# Altium integrated library Altium_WE-VD (rev23a).IntLib: 78 symbols (continued)
## 820523211
designator RV?, comment 320VAC, 418VDC  (value not drawn)
WE-VD Disk Varistor, THT, 320VAC, 418VDC, 760pF; Manufacturer Part Number: 820523211; Manufacturer: Wurth Elektronik; Clamping Voltage: 842V; Energy Absorption: 296J; Operating Voltage (AC): 320V; Operating Voltage (DC): 418V; Pitch: 1.5mm; Power Dissipation: 1W; (Reverse) Breakdown Voltage: 510V; (Reverse) Peak Pulse Current: 6500A; Category: Surge Protection; Match Code: WE-VD; ComponentLink1Description: Website Link; ComponentLink1URL: https://www.we-online.com/redexpert/article/820523211?ad; ComponentLink2Description: Datasheet Link; ComponentLink2URL: https://www.we-online.com/redexpert/spec/820523211?ad; Mount: Through Hole; Operating Temperature Max: 85°C; Operating Temperature Min: -40°C; Packaging: Tape and Reel; Width: 7.7mm; Height: 27mm; Diameter: 23mm; Channel Input Capacitance: 760pF
footprint D23W7.7H27P1.5
pins: 1, 2

## 820523811B
designator RV?, comment 385VAC, 505VDC  (value not drawn)
WE-VD Disk Varistor, THT, 385VAC, 505VDC, 600pF; Manufacturer Part Number: 820523811B; Manufacturer: Wurth Elektronik; Clamping Voltage: 1025V; Energy Absorption: 328J; Operating Voltage (AC): 385V; Operating Voltage (DC): 505V; Pitch: 2mm; Power Dissipation: 1W; (Reverse) Breakdown Voltage: 620V; (Reverse) Peak Pulse Current: 6500A; Category: Surge Protection; Match Code: WE-VD; ComponentLink1Description: Website Link; ComponentLink1URL: https://www.we-online.com/redexpert/article/820523811B?ad; ComponentLink2Description: Datasheet Link; ComponentLink2URL: https://www.we-online.com/redexpert/spec/820523811B?ad; Mount: Through Hole; Operating Temperature Max: 85°C; Operating Temperature Min: -40°C; Packaging: Tape and Reel; Width: 8.3mm; Height: 27mm; Diameter: 23mm; Channel Input Capacitance: 600pF
footprint D23W8.3H27P2
pins: 1, 2

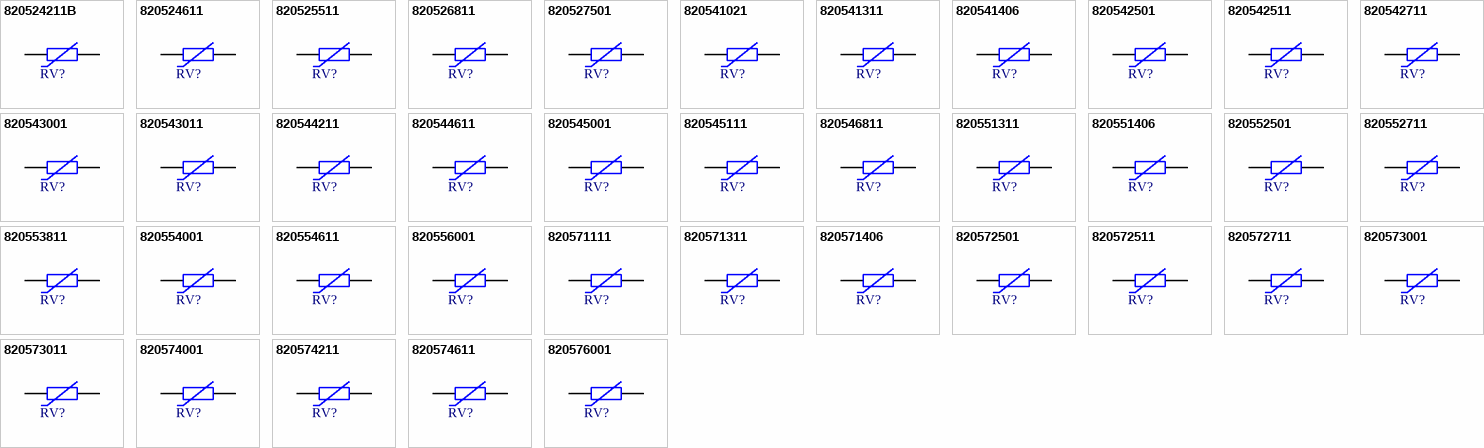
[diagram p1: symbols 820524211B to 820576001]

## 820524211B
designator RV?, comment 420VAC, 560VDC  (value not drawn)
WE-VD Disk Varistor, THT, 420VAC, 560VDC, 570pF; Manufacturer Part Number: 820524211B; Manufacturer: Wurth Elektronik; Clamping Voltage: 1120V; Energy Absorption: 344J; Operating Voltage (AC): 420V; Operating Voltage (DC): 560V; Pitch: 2.3mm; Power Dissipation: 1W; (Reverse) Breakdown Voltage: 680V; (Reverse) Peak Pulse Current: 6500A; Category: Surge Protection; Match Code: WE-VD; ComponentLink1Description: Website Link; ComponentLink1URL: https://www.we-online.com/redexpert/article/820524211B?ad; ComponentLink2Description: Datasheet Link; ComponentLink2URL: https://www.we-online.com/redexpert/spec/820524211B?ad; Mount: Through Hole; Operating Temperature Max: 85°C; Operating Temperature Min: -40°C; Packaging: Tape and Reel; Width: 8.7mm; Height: 27mm; Diameter: 23mm; Channel Input Capacitance: 570pF
footprint D23W8.7H27P2.3
pins: 1, 2

## 820524611
designator RV?, comment 460VAC, 615VDC  (value not drawn)
WE-VD Disk Varistor, THT, 460VAC, 615VDC, 520pF; Manufacturer Part Number: 820524611; Manufacturer: Wurth Elektronik; Clamping Voltage: 1240V; Energy Absorption: 360J; Operating Voltage (AC): 460V; Operating Voltage (DC): 615V; Pitch: 2.6mm; Power Dissipation: 1W; (Reverse) Breakdown Voltage: 750V; (Reverse) Peak Pulse Current: 6500A; Category: Surge Protection; Match Code: WE-VD; ComponentLink1Description: Website Link; ComponentLink1URL: https://www.we-online.com/redexpert/article/820524611?ad; ComponentLink2Description: Datasheet Link; ComponentLink2URL: https://www.we-online.com/redexpert/spec/820524611?ad; Mount: Through Hole; Operating Temperature Max: 85°C; Operating Temperature Min: -40°C; Packaging: Tape and Reel; Width: 9.1mm; Height: 27mm; Diameter: 23mm; Channel Input Capacitance: 520pF
footprint D23W9.1H27P2.6
pins: 1, 2

## 820525511
designator RV?, comment 550VAC, 745VDC  (value not drawn)
WE-VD Disk Varistor, THT, 550VAC, 745VDC, 430pF; Manufacturer Part Number: 820525511; Manufacturer: Wurth Elektronik; Clamping Voltage: 1500V; Energy Absorption: 408J; Operating Voltage (AC): 550V; Operating Voltage (DC): 745V; Pitch: 3.4mm; Power Dissipation: 1W; (Reverse) Breakdown Voltage: 910V; (Reverse) Peak Pulse Current: 6500A; Category: Surge Protection; Match Code: WE-VD; ComponentLink1Description: Website Link; ComponentLink1URL: https://www.we-online.com/redexpert/article/820525511?ad; ComponentLink2Description: Datasheet Link; ComponentLink2URL: https://www.we-online.com/redexpert/spec/820525511?ad; Mount: Through Hole; Operating Temperature Max: 85°C; Operating Temperature Min: -40°C; Packaging: Tape and Reel; Width: 10.1mm; Height: 27mm; Diameter: 23mm; Channel Input Capacitance: 430pF
footprint D23W10.1H27P3.4
pins: 1, 2

## 820526811
designator RV?, comment 680VAC, 895VDC  (value not drawn)
WE-VD Disk Varistor, THT, 680VAC, 895VDC, 360pF; Manufacturer Part Number: 820526811; Manufacturer: Wurth Elektronik; Clamping Voltage: 1815V; Energy Absorption: 496J; Operating Voltage (AC): 680V; Operating Voltage (DC): 895V; Pitch: 4.3mm; Power Dissipation: 1W; (Reverse) Breakdown Voltage: 1100V; (Reverse) Peak Pulse Current: 6500A; Category: Surge Protection; Match Code: WE-VD; ComponentLink1Description: Website Link; ComponentLink1URL: https://www.we-online.com/redexpert/article/820526811?ad; ComponentLink2Description: Datasheet Link; ComponentLink2URL: https://www.we-online.com/redexpert/spec/820526811?ad; Mount: Through Hole; Operating Temperature Max: 85°C; Operating Temperature Min: -40°C; Packaging: Tape and Reel; Width: 11.2mm; Height: 27mm; Diameter: 23mm; Channel Input Capacitance: 360pF
footprint D23W11.2H27P4.3
pins: 1, 2

## 820527501
designator RV?, comment 75VAC, 100VDC  (value not drawn)
WE-VD Disk Varistor, THT, 75VAC, 100VDC, 3800pF; Manufacturer Part Number: 820527501; Manufacturer: Wurth Elektronik; Clamping Voltage: 200V; Energy Absorption: 64J; Operating Voltage (AC): 75V; Operating Voltage (DC): 100V; Pitch: 0.8mm; Power Dissipation: 1W; (Reverse) Breakdown Voltage: 120V; (Reverse) Peak Pulse Current: 6500A; Category: Surge Protection; Match Code: WE-VD; ComponentLink1Description: Website Link; ComponentLink1URL: https://www.we-online.com/redexpert/article/820527501?ad; ComponentLink2Description: Datasheet Link; ComponentLink2URL: https://www.we-online.com/redexpert/spec/820527501?ad; Mount: Through Hole; Operating Temperature Max: 85°C; Operating Temperature Min: -40°C; Packaging: Tape and Reel; Width: 5.1mm; Height: 26.5mm; Diameter: 23mm; Channel Input Capacitance: 3800pF
footprint D23W5.1H26.5P0.8
pins: 1, 2

## 820541021
designator RV?, comment 1000VAC, 1465VDC  (value not drawn)
WE-VD Disk Varistor, THT, 1000VAC, 1465VDC, 150pF; Manufacturer Part Number: 820541021; Manufacturer: Wurth Elektronik; Clamping Voltage: 2970V; Energy Absorption: 348J; Operating Voltage (AC): 1000V; Operating Voltage (DC): 1465V; Pitch: 10.2mm; Power Dissipation: 0.6W; (Reverse) Breakdown Voltage: 1800V; (Reverse) Peak Pulse Current: 4500A; Category: Surge Protection; Match Code: WE-VD; ComponentLink1Description: Website Link; ComponentLink1URL: https://www.we-online.com/redexpert/article/820541021?ad; ComponentLink2Description: Datasheet Link; ComponentLink2URL: https://www.we-online.com/redexpert/spec/820541021?ad; Mount: Through Hole; Operating Temperature Max: 85°C; Operating Temperature Min: -40°C; Packaging: Tape and Reel; Width: 12.8mm; Height: 22.5mm; Diameter: 16.5mm; Channel Input Capacitance: 150pF
footprint D16.5W12.8H22.5P10.2
pins: 1, 2

## 820541311
designator RV?, comment 130VAC, 170VDC  (value not drawn)
WE-VD Disk Varistor, THT, 130VAC, 170VDC, 840pF; Manufacturer Part Number: 820541311; Manufacturer: Wurth Elektronik; Clamping Voltage: 340V; Energy Absorption: 57J; Operating Voltage (AC): 130V; Operating Voltage (DC): 170V; Pitch: 0.8mm; Power Dissipation: 0.6W; (Reverse) Breakdown Voltage: 200V; (Reverse) Peak Pulse Current: 4500A; Category: Surge Protection; Match Code: WE-VD; ComponentLink1Description: Website Link; ComponentLink1URL: https://www.we-online.com/redexpert/article/820541311?ad; ComponentLink2Description: Datasheet Link; ComponentLink2URL: https://www.we-online.com/redexpert/spec/820541311?ad; Mount: Through Hole; Operating Temperature Max: 85°C; Operating Temperature Min: -40°C; Packaging: Tape and Reel; Width: 4.8mm; Height: 19.5mm; Diameter: 16.5mm; Channel Input Capacitance: 840pF
footprint D16.5W4.8H19.5P0.8
pins: 1, 2

## 820541406
designator RV?, comment 14VAC, 18VDC  (value not drawn)
WE-VD Disk Varistor, THT, 14VAC, 18VDC, 11960pF; Manufacturer Part Number: 820541406; Manufacturer: Wurth Elektronik; Clamping Voltage: 43V; Energy Absorption: 5.4J; Operating Voltage (AC): 14V; Operating Voltage (DC): 18V; Pitch: 0.8mm; Power Dissipation: 0.1W; (Reverse) Breakdown Voltage: 22V; (Reverse) Peak Pulse Current: 1000A; Category: Surge Protection; Match Code: WE-VD; ComponentLink1Description: Website Link; ComponentLink1URL: https://www.we-online.com/redexpert/article/820541406?ad; ComponentLink2Description: Datasheet Link; ComponentLink2URL: https://www.we-online.com/redexpert/spec/820541406?ad; Mount: Through Hole; Operating Temperature Max: 85°C; Operating Temperature Min: -40°C; Packaging: Tape and Reel; Width: 5mm; Height: 19.5mm; Diameter: 16.5mm; Channel Input Capacitance: 11960pF
footprint D16.5W5H19.5P0.8
pins: 1, 2

## 820542501
designator RV?, comment 25VAC, 31VDC  (value not drawn)
WE-VD Disk Varistor, THT, 25VAC, 31VDC, 7620pF; Manufacturer Part Number: 820542501; Manufacturer: Wurth Elektronik; Clamping Voltage: 77V; Energy Absorption: 9.4J; Operating Voltage (AC): 25V; Operating Voltage (DC): 31V; Pitch: 0.8mm; Power Dissipation: 0.1W; (Reverse) Breakdown Voltage: 39V; (Reverse) Peak Pulse Current: 1000A; Category: Surge Protection; Match Code: WE-VD; ComponentLink1Description: Website Link; ComponentLink1URL: https://www.we-online.com/redexpert/article/820542501?ad; ComponentLink2Description: Datasheet Link; ComponentLink2URL: https://www.we-online.com/redexpert/spec/820542501?ad; Mount: Through Hole; Operating Temperature Max: 85°C; Operating Temperature Min: -40°C; Packaging: Tape and Reel; Width: 5.2mm; Height: 19.5mm; Diameter: 16.5mm; Channel Input Capacitance: 7620pF
footprint D16.5W5.2H19.5P0.8
pins: 1, 2

## 820542511
designator RV?, comment 250VAC, 320VDC  (value not drawn)
WE-VD Disk Varistor, THT, 250VAC, 320VDC, 460pF; Manufacturer Part Number: 820542511; Manufacturer: Wurth Elektronik; Clamping Voltage: 650V; Energy Absorption: 120J; Operating Voltage (AC): 250V; Operating Voltage (DC): 320V; Pitch: 1.1mm; Power Dissipation: 0.6W; (Reverse) Breakdown Voltage: 390V; (Reverse) Peak Pulse Current: 4500A; Category: Surge Protection; Match Code: WE-VD; ComponentLink1Description: Website Link; ComponentLink1URL: https://www.we-online.com/redexpert/article/820542511?ad; ComponentLink2Description: Datasheet Link; ComponentLink2URL: https://www.we-online.com/redexpert/spec/820542511?ad; Mount: Through Hole; Operating Temperature Max: 85°C; Operating Temperature Min: -40°C; Packaging: Tape and Reel; Width: 5.9mm; Height: 20mm; Diameter: 16.5mm; Channel Input Capacitance: 460pF
footprint D16.5W5.9H20P1.1
pins: 1, 2

## 820542711
designator RV?, comment 275VAC, 350VDC  (value not drawn)
WE-VD Disk Varistor, THT, 275VAC, 350VDC, 450pF; Manufacturer Part Number: 820542711; Manufacturer: Wurth Elektronik; Clamping Voltage: 710V; Energy Absorption: 132J; Operating Voltage (AC): 275V; Operating Voltage (DC): 350V; Pitch: 1.3mm; Power Dissipation: 0.6W; (Reverse) Breakdown Voltage: 430V; (Reverse) Peak Pulse Current: 4500A; Category: Surge Protection; Match Code: WE-VD; ComponentLink1Description: Website Link; ComponentLink1URL: https://www.we-online.com/redexpert/article/820542711?ad; ComponentLink2Description: Datasheet Link; ComponentLink2URL: https://www.we-online.com/redexpert/spec/820542711?ad; Mount: Through Hole; Operating Temperature Max: 85°C; Operating Temperature Min: -40°C; Packaging: Tape and Reel; Width: 6.7mm; Height: 20mm; Diameter: 16.5mm; Channel Input Capacitance: 450pF
footprint D16.5W6.7H20P1.3
pins: 1, 2

## 820543001
designator RV?, comment 30VAC, 38VDC  (value not drawn)
WE-VD Disk Varistor, THT, 30VAC, 38VDC, 6420pF; Manufacturer Part Number: 820543001; Manufacturer: Wurth Elektronik; Clamping Voltage: 93V; Energy Absorption: 12J; Operating Voltage (AC): 30V; Operating Voltage (DC): 38V; Pitch: 0.8mm; Power Dissipation: 0.1W; (Reverse) Breakdown Voltage: 47V; (Reverse) Peak Pulse Current: 1000A; Category: Surge Protection; Match Code: WE-VD; ComponentLink1Description: Website Link; ComponentLink1URL: https://www.we-online.com/redexpert/article/820543001?ad; ComponentLink2Description: Datasheet Link; ComponentLink2URL: https://www.we-online.com/redexpert/spec/820543001?ad; Mount: Through Hole; Operating Temperature Max: 85°C; Operating Temperature Min: -40°C; Packaging: Tape and Reel; Width: 5.6mm; Height: 19.5mm; Diameter: 16.5mm; Channel Input Capacitance: 6420pF
footprint D16.5W5.6H19.5P0.8
pins: 1, 2

## 820543011
designator RV?, comment 300VAC, 385VDC  (value not drawn)
WE-VD Disk Varistor, THT, 300VAC, 385VDC, 420pF; Manufacturer Part Number: 820543011; Manufacturer: Wurth Elektronik; Clamping Voltage: 775V; Energy Absorption: 140J; Operating Voltage (AC): 300V; Operating Voltage (DC): 385V; Pitch: 1.5mm; Power Dissipation: 0.6W; (Reverse) Breakdown Voltage: 470V; (Reverse) Peak Pulse Current: 4500A; Category: Surge Protection; Match Code: WE-VD; ComponentLink1Description: Website Link; ComponentLink1URL: https://www.we-online.com/redexpert/article/820543011?ad; ComponentLink2Description: Datasheet Link; ComponentLink2URL: https://www.we-online.com/redexpert/spec/820543011?ad; Mount: Through Hole; Operating Temperature Max: 85°C; Operating Temperature Min: -40°C; Packaging: Tape and Reel; Width: 7mm; Height: 20mm; Diameter: 16.5mm; Channel Input Capacitance: 420pF
footprint D16.5W7H20P1.5
pins: 1, 2

## 820544211
designator RV?, comment 420VAC, 560VDC  (value not drawn)
WE-VD Disk Varistor, THT, 420VAC, 560VDC, 290pF; Manufacturer Part Number: 820544211; Manufacturer: Wurth Elektronik; Clamping Voltage: 1120V; Energy Absorption: 172J; Operating Voltage (AC): 420V; Operating Voltage (DC): 560V; Pitch: 2.5mm; Power Dissipation: 0.6W; (Reverse) Breakdown Voltage: 680V; (Reverse) Peak Pulse Current: 4500A; Category: Surge Protection; Match Code: WE-VD; ComponentLink1Description: Website Link; ComponentLink1URL: https://www.we-online.com/redexpert/article/820544211?ad; ComponentLink2Description: Datasheet Link; ComponentLink2URL: https://www.we-online.com/redexpert/spec/820544211?ad; Mount: Through Hole; Operating Temperature Max: 85°C; Operating Temperature Min: -40°C; Packaging: Tape and Reel; Width: 8.2mm; Height: 20.5mm; Diameter: 16.5mm; Channel Input Capacitance: 290pF
footprint D16.5W8.2H20.5P2.5
pins: 1, 2

## 820544611
designator RV?, comment 460VAC, 615VDC  (value not drawn)
WE-VD Disk Varistor, THT, 460VAC, 615VDC, 270pF; Manufacturer Part Number: 820544611; Manufacturer: Wurth Elektronik; Clamping Voltage: 1240V; Energy Absorption: 180J; Operating Voltage (AC): 460V; Operating Voltage (DC): 615V; Pitch: 2.8mm; Power Dissipation: 0.6W; (Reverse) Breakdown Voltage: 750V; (Reverse) Peak Pulse Current: 4500A; Category: Surge Protection; Match Code: WE-VD; ComponentLink1Description: Website Link; ComponentLink1URL: https://www.we-online.com/redexpert/article/820544611?ad; ComponentLink2Description: Datasheet Link; ComponentLink2URL: https://www.we-online.com/redexpert/spec/820544611?ad; Mount: Through Hole; Operating Temperature Max: 85°C; Operating Temperature Min: -40°C; Packaging: Tape and Reel; Width: 8.6mm; Height: 20.5mm; Diameter: 16.5mm; Channel Input Capacitance: 270pF
footprint D16.5W8.6H20.5P2.8
pins: 1, 2

## 820545001
designator RV?, comment 50VAC, 65VDC  (value not drawn)
WE-VD Disk Varistor, THT, 50VAC, 65VDC, 2970pF; Manufacturer Part Number: 820545001; Manufacturer: Wurth Elektronik; Clamping Voltage: 135V; Energy Absorption: 22J; Operating Voltage (AC): 50V; Operating Voltage (DC): 65V; Pitch: 0.8mm; Power Dissipation: 0.6W; (Reverse) Breakdown Voltage: 82V; (Reverse) Peak Pulse Current: 1000A; Category: Surge Protection; Match Code: WE-VD; ComponentLink1Description: Website Link; ComponentLink1URL: https://www.we-online.com/redexpert/article/820545001?ad; ComponentLink2Description: Datasheet Link; ComponentLink2URL: https://www.we-online.com/redexpert/spec/820545001?ad; Mount: Through Hole; Operating Temperature Max: 85°C; Operating Temperature Min: -40°C; Packaging: Tape and Reel; Width: 4.4mm; Height: 19.5mm; Diameter: 16.5mm; Channel Input Capacitance: 2970pF
footprint D16.5W4.4H19.5P0.8
pins: 1, 2

## 820545111
designator RV?, comment 510VAC, 670VDC  (value not drawn)
WE-VD Disk Varistor, THT, 510VAC, 670VDC, 250pF; Manufacturer Part Number: 820545111; Manufacturer: Wurth Elektronik; Clamping Voltage: 1355V; Energy Absorption: 188J; Operating Voltage (AC): 510V; Operating Voltage (DC): 670V; Pitch: 3.1mm; Power Dissipation: 0.6W; (Reverse) Breakdown Voltage: 820V; (Reverse) Peak Pulse Current: 4500A; Category: Surge Protection; Match Code: WE-VD; ComponentLink1Description: Website Link; ComponentLink1URL: https://www.we-online.com/redexpert/article/820545111?ad; ComponentLink2Description: Datasheet Link; ComponentLink2URL: https://www.we-online.com/redexpert/spec/820545111?ad; Mount: Through Hole; Operating Temperature Max: 85°C; Operating Temperature Min: -40°C; Packaging: Tape and Reel; Width: 9mm; Height: 20.5mm; Diameter: 16.5mm; Channel Input Capacitance: 250pF
footprint D16.5W9H20.5P3.1
pins: 1, 2

## 820546811
designator RV?, comment 680VAC, 895VDC  (value not drawn)
WE-VD Disk Varistor, THT, 680VAC, 895VDC, 180pF; Manufacturer Part Number: 820546811; Manufacturer: Wurth Elektronik; Clamping Voltage: 1815V; Energy Absorption: 248J; Operating Voltage (AC): 680V; Operating Voltage (DC): 895V; Pitch: 4.5mm; Power Dissipation: 0.6W; (Reverse) Breakdown Voltage: 1100V; (Reverse) Peak Pulse Current: 4500A; Category: Surge Protection; Match Code: WE-VD; ComponentLink1Description: Website Link; ComponentLink1URL: https://www.we-online.com/redexpert/article/820546811?ad; ComponentLink2Description: Datasheet Link; ComponentLink2URL: https://www.we-online.com/redexpert/spec/820546811?ad; Mount: Through Hole; Operating Temperature Max: 85°C; Operating Temperature Min: -40°C; Packaging: Tape and Reel; Width: 10.7mm; Height: 20.5mm; Diameter: 16.5mm; Channel Input Capacitance: 180pF
footprint D16.5W10.7H20.5P4.5
pins: 1, 2

## 820551311
designator RV?, comment 130VAC, 170VDC  (value not drawn)
WE-VD Disk Varistor, THT, 130VAC, 170VDC, 135pF; Manufacturer Part Number: 820551311; Manufacturer: Wurth Elektronik; Clamping Voltage: 355V; Energy Absorption: 7.1J; Operating Voltage (AC): 130V; Operating Voltage (DC): 170V; Pitch: 0.8mm; Power Dissipation: 0.1W; (Reverse) Breakdown Voltage: 200V; (Reverse) Peak Pulse Current: 400A; Category: Surge Protection; Match Code: WE-VD; ComponentLink1Description: Website Link; ComponentLink1URL: https://www.we-online.com/redexpert/article/820551311?ad; ComponentLink2Description: Datasheet Link; ComponentLink2URL: https://www.we-online.com/redexpert/spec/820551311?ad; Mount: Through Hole; Operating Temperature Max: 85°C; Operating Temperature Min: -40°C; Packaging: Tape and Reel; Width: 4.2mm; Height: 10.5mm; Diameter: 7.5mm; Channel Input Capacitance: 135pF
footprint D7.5W4.2H10.5P0.8
pins: 1, 2

## 820551406
designator RV?, comment 14VAC, 18VDC  (value not drawn)
WE-VD Disk Varistor, THT, 14VAC, 18VDC, 1130pF; Manufacturer Part Number: 820551406; Manufacturer: Wurth Elektronik; Clamping Voltage: 48V; Energy Absorption: 0.7J; Operating Voltage (AC): 14V; Operating Voltage (DC): 18V; Pitch: 0.8mm; Power Dissipation: 0.01W; (Reverse) Breakdown Voltage: 22V; (Reverse) Peak Pulse Current: 100A; Category: Surge Protection; Match Code: WE-VD; ComponentLink1Description: Website Link; ComponentLink1URL: https://www.we-online.com/redexpert/article/820551406?ad; ComponentLink2Description: Datasheet Link; ComponentLink2URL: https://www.we-online.com/redexpert/spec/820551406?ad; Mount: Through Hole; Operating Temperature Max: 85°C; Operating Temperature Min: -40°C; Packaging: Tape and Reel; Width: 4.5mm; Height: 10.5mm; Diameter: 7.5mm; Channel Input Capacitance: 1130pF
footprint D7.5W4.5H10.5P0.8
pins: 1, 2

## 820552501
designator RV?, comment 25VAC, 31VDC  (value not drawn)
WE-VD Disk Varistor, THT, 25VAC, 31VDC, 830pF; Manufacturer Part Number: 820552501; Manufacturer: Wurth Elektronik; Clamping Voltage: 86V; Energy Absorption: 1.2J; Operating Voltage (AC): 25V; Operating Voltage (DC): 31V; Pitch: 0.8mm; Power Dissipation: 0.01W; (Reverse) Breakdown Voltage: 39V; (Reverse) Peak Pulse Current: 100A; Category: Surge Protection; Match Code: WE-VD; ComponentLink1Description: Website Link; ComponentLink1URL: https://www.we-online.com/redexpert/article/820552501?ad; ComponentLink2Description: Datasheet Link; ComponentLink2URL: https://www.we-online.com/redexpert/spec/820552501?ad; Mount: Through Hole; Operating Temperature Max: 85°C; Operating Temperature Min: -40°C; Packaging: Tape and Reel; Width: 4.7mm; Height: 10.5mm; Diameter: 7.5mm; Channel Input Capacitance: 830pF
footprint D7.5W4.7H10.5P0.8
pins: 1, 2

## 820552711
designator RV?, comment 275VAC, 350VDC  (value not drawn)
WE-VD Disk Varistor, THT, 275VAC, 350VDC, 65pF; Manufacturer Part Number: 820552711; Manufacturer: Wurth Elektronik; Clamping Voltage: 745V; Energy Absorption: 16.5J; Operating Voltage (AC): 275V; Operating Voltage (DC): 350V; Pitch: 1.5mm; Power Dissipation: 0.1W; (Reverse) Breakdown Voltage: 430V; (Reverse) Peak Pulse Current: 400A; Category: Surge Protection; Match Code: WE-VD; ComponentLink1Description: Website Link; ComponentLink1URL: https://www.we-online.com/redexpert/article/820552711?ad; ComponentLink2Description: Datasheet Link; ComponentLink2URL: https://www.we-online.com/redexpert/spec/820552711?ad; Mount: Through Hole; Operating Temperature Max: 85°C; Operating Temperature Min: -40°C; Packaging: Tape and Reel; Width: 6.1mm; Height: 11mm; Diameter: 7.5mm; Channel Input Capacitance: 65pF
footprint D7.5W6.1H11P1.5
pins: 1, 2

## 820553811
designator RV?, comment 385VAC, 505VDC  (value not drawn)
WE-VD Disk Varistor, THT, 385VAC, 505VDC, 45pF; Manufacturer Part Number: 820553811; Manufacturer: Wurth Elektronik; Clamping Voltage: 1050V; Energy Absorption: 20.5J; Operating Voltage (AC): 385V; Operating Voltage (DC): 505V; Pitch: 2.4mm; Power Dissipation: 0.1W; (Reverse) Breakdown Voltage: 620V; (Reverse) Peak Pulse Current: 400A; Category: Surge Protection; Match Code: WE-VD; ComponentLink1Description: Website Link; ComponentLink1URL: https://www.we-online.com/redexpert/article/820553811?ad; ComponentLink2Description: Datasheet Link; ComponentLink2URL: https://www.we-online.com/redexpert/spec/820553811?ad; Mount: Through Hole; Operating Temperature Max: 85°C; Operating Temperature Min: -40°C; Packaging: Tape and Reel; Width: 7.2mm; Height: 11.5mm; Diameter: 7.5mm; Channel Input Capacitance: 45pF
footprint D7.5W7.2H11.5P2.4
pins: 1, 2

## 820554001
designator RV?, comment 40VAC, 56VDC  (value not drawn)
WE-VD Disk Varistor, THT, 40VAC, 56VDC, 500pF; Manufacturer Part Number: 820554001; Manufacturer: Wurth Elektronik; Clamping Voltage: 150V; Energy Absorption: 2.1J; Operating Voltage (AC): 40V; Operating Voltage (DC): 56V; Pitch: 1.5mm; Power Dissipation: 0.01W; (Reverse) Breakdown Voltage: 68V; (Reverse) Peak Pulse Current: 100A; Category: Surge Protection; Match Code: WE-VD; ComponentLink1Description: Website Link; ComponentLink1URL: https://www.we-online.com/redexpert/article/820554001?ad; ComponentLink2Description: Datasheet Link; ComponentLink2URL: https://www.we-online.com/redexpert/spec/820554001?ad; Mount: Through Hole; Operating Temperature Max: 85°C; Operating Temperature Min: -40°C; Packaging: Tape and Reel; Width: 5.5mm; Height: 10.5mm; Diameter: 7.5mm; Channel Input Capacitance: 500pF
footprint D7.5W5.5H10.5P1.5
pins: 1, 2

## 820554611
designator RV?, comment 460VAC, 615VDC  (value not drawn)
WE-VD Disk Varistor, THT, 460VAC, 615VDC, 35pF; Manufacturer Part Number: 820554611; Manufacturer: Wurth Elektronik; Clamping Voltage: 1290V; Energy Absorption: 22.5J; Operating Voltage (AC): 460V; Operating Voltage (DC): 615V; Pitch: 3mm; Power Dissipation: 0.1W; (Reverse) Breakdown Voltage: 750V; (Reverse) Peak Pulse Current: 400A; Category: Surge Protection; Match Code: WE-VD; ComponentLink1Description: Website Link; ComponentLink1URL: https://www.we-online.com/redexpert/article/820554611?ad; ComponentLink2Description: Datasheet Link; ComponentLink2URL: https://www.we-online.com/redexpert/spec/820554611?ad; Mount: Through Hole; Operating Temperature Max: 85°C; Operating Temperature Min: -40°C; Packaging: Tape and Reel; Width: 7.9mm; Height: 11.5mm; Diameter: 7.5mm; Channel Input Capacitance: 35pF
footprint D7.5W7.9H11.5P3
pins: 1, 2

## 820556001
designator RV?, comment 60VAC, 85VDC  (value not drawn)
WE-VD Disk Varistor, THT, 60VAC, 85VDC, 260pF; Manufacturer Part Number: 820556001; Manufacturer: Wurth Elektronik; Clamping Voltage: 175V; Energy Absorption: 3.5J; Operating Voltage (AC): 60V; Operating Voltage (DC): 85V; Pitch: 0.8mm; Power Dissipation: 0.1W; (Reverse) Breakdown Voltage: 100V; (Reverse) Peak Pulse Current: 400A; Category: Surge Protection; Match Code: WE-VD; ComponentLink1Description: Website Link; ComponentLink1URL: https://www.we-online.com/redexpert/article/820556001?ad; ComponentLink2Description: Datasheet Link; ComponentLink2URL: https://www.we-online.com/redexpert/spec/820556001?ad; Mount: Through Hole; Operating Temperature Max: 85°C; Operating Temperature Min: -40°C; Packaging: Tape and Reel; Width: 3.9mm; Height: 10.5mm; Diameter: 7.5mm; Channel Input Capacitance: 260pF
footprint D7.5W3.9H10.5P0.8
pins: 1, 2

## 820571111
designator RV?, comment 115VAC, 150VDC  (value not drawn)
WE-VD Disk Varistor, THT, 115VAC, 150VDC, 220pF; Manufacturer Part Number: 820571111; Manufacturer: Wurth Elektronik; Clamping Voltage: 300V; Energy Absorption: 13J; Operating Voltage (AC): 115V; Operating Voltage (DC): 150V; Pitch: 0.8mm; Power Dissipation: 0.25W; (Reverse) Breakdown Voltage: 180V; (Reverse) Peak Pulse Current: 1200A; Category: Surge Protection; Match Code: WE-VD; ComponentLink1Description: Website Link; ComponentLink1URL: https://www.we-online.com/redexpert/article/820571111?ad; ComponentLink2Description: Datasheet Link; ComponentLink2URL: https://www.we-online.com/redexpert/spec/820571111?ad; Mount: Through Hole; Operating Temperature Max: 85°C; Operating Temperature Min: -40°C; Packaging: Tape and Reel; Width: 4.1mm; Height: 12mm; Diameter: 9mm; Channel Input Capacitance: 220pF
footprint D9W4.1H12P0.8
pins: 1, 2

## 820571311
designator RV?, comment 130VAC, 170VDC  (value not drawn)
WE-VD Disk Varistor, THT, 130VAC, 170VDC, 210pF; Manufacturer Part Number: 820571311; Manufacturer: Wurth Elektronik; Clamping Voltage: 340V; Energy Absorption: 14.3J; Operating Voltage (AC): 130V; Operating Voltage (DC): 170V; Pitch: 0.8mm; Power Dissipation: 0.25W; (Reverse) Breakdown Voltage: 200V; (Reverse) Peak Pulse Current: 1200A; Category: Surge Protection; Match Code: WE-VD; ComponentLink1Description: Website Link; ComponentLink1URL: https://www.we-online.com/redexpert/article/820571311?ad; ComponentLink2Description: Datasheet Link; ComponentLink2URL: https://www.we-online.com/redexpert/spec/820571311?ad; Mount: Through Hole; Operating Temperature Max: 85°C; Operating Temperature Min: -40°C; Packaging: Tape and Reel; Width: 4.2mm; Height: 12mm; Diameter: 9mm; Channel Input Capacitance: 210pF
footprint D9W4.2H12P0.8
pins: 1, 2

## 820571406
designator RV?, comment 14VAC, 18VDC  (value not drawn)
WE-VD Disk Varistor, THT, 14VAC, 18VDC, 2930pF; Manufacturer Part Number: 820571406; Manufacturer: Wurth Elektronik; Clamping Voltage: 43V; Energy Absorption: 1.4J; Operating Voltage (AC): 14V; Operating Voltage (DC): 18V; Pitch: 0.8mm; Power Dissipation: 0.02W; (Reverse) Breakdown Voltage: 22V; (Reverse) Peak Pulse Current: 250A; Category: Surge Protection; Match Code: WE-VD; ComponentLink1Description: Website Link; ComponentLink1URL: https://www.we-online.com/redexpert/article/820571406?ad; ComponentLink2Description: Datasheet Link; ComponentLink2URL: https://www.we-online.com/redexpert/spec/820571406?ad; Mount: Through Hole; Operating Temperature Max: 85°C; Operating Temperature Min: -40°C; Packaging: Tape and Reel; Width: 4.5mm; Height: 12mm; Diameter: 9mm; Channel Input Capacitance: 2930pF
footprint D9W4.5H12P0.8
pins: 1, 2

## 820572501
designator RV?, comment 25VAC, 31VDC  (value not drawn)
WE-VD Disk Varistor, THT, 25VAC, 31VDC, 1820pF; Manufacturer Part Number: 820572501; Manufacturer: Wurth Elektronik; Clamping Voltage: 77V; Energy Absorption: 2.4J; Operating Voltage (AC): 25V; Operating Voltage (DC): 31V; Pitch: 0.8mm; Power Dissipation: 0.02W; (Reverse) Breakdown Voltage: 39V; (Reverse) Peak Pulse Current: 250A; Category: Surge Protection; Match Code: WE-VD; ComponentLink1Description: Website Link; ComponentLink1URL: https://www.we-online.com/redexpert/article/820572501?ad; ComponentLink2Description: Datasheet Link; ComponentLink2URL: https://www.we-online.com/redexpert/spec/820572501?ad; Mount: Through Hole; Operating Temperature Max: 85°C; Operating Temperature Min: -40°C; Packaging: Tape and Reel; Width: 4.7mm; Height: 12mm; Diameter: 9mm; Channel Input Capacitance: 1820pF
footprint D9W4.7H12P0.8
pins: 1, 2

## 820572511
designator RV?, comment 250VAC, 320VDC  (value not drawn)
WE-VD Disk Varistor, THT, 250VAC, 320VDC, 110pF; Manufacturer Part Number: 820572511; Manufacturer: Wurth Elektronik; Clamping Voltage: 650V; Energy Absorption: 30J; Operating Voltage (AC): 250V; Operating Voltage (DC): 320V; Pitch: 1.3mm; Power Dissipation: 0.25W; (Reverse) Breakdown Voltage: 390V; (Reverse) Peak Pulse Current: 1200A; Category: Surge Protection; Match Code: WE-VD; ComponentLink1Description: Website Link; ComponentLink1URL: https://www.we-online.com/redexpert/article/820572511?ad; ComponentLink2Description: Datasheet Link; ComponentLink2URL: https://www.we-online.com/redexpert/spec/820572511?ad; Mount: Through Hole; Operating Temperature Max: 85°C; Operating Temperature Min: -40°C; Packaging: Tape and Reel; Width: 5.3mm; Height: 12.5mm; Diameter: 9mm; Channel Input Capacitance: 110pF
footprint D9W5.3H12.5P1.3
pins: 1, 2

## 820572711
designator RV?, comment 275VAC, 350VDC  (value not drawn)
WE-VD Disk Varistor, THT, 275VAC, 350VDC, 105pF; Manufacturer Part Number: 820572711; Manufacturer: Wurth Elektronik; Clamping Voltage: 710V; Energy Absorption: 33J; Operating Voltage (AC): 275V; Operating Voltage (DC): 350V; Pitch: 1.5mm; Power Dissipation: 0.25W; (Reverse) Breakdown Voltage: 430V; (Reverse) Peak Pulse Current: 1200A; Category: Surge Protection; Match Code: WE-VD; ComponentLink1Description: Website Link; ComponentLink1URL: https://www.we-online.com/redexpert/article/820572711?ad; ComponentLink2Description: Datasheet Link; ComponentLink2URL: https://www.we-online.com/redexpert/spec/820572711?ad; Mount: Through Hole; Operating Temperature Max: 85°C; Operating Temperature Min: -40°C; Packaging: Tape and Reel; Width: 6.1mm; Height: 12.5mm; Diameter: 9mm; Channel Input Capacitance: 105pF
footprint D9W6.1H12.5P1.5
pins: 1, 2

## 820573001
designator RV?, comment 30VAC, 38VDC  (value not drawn)
WE-VD Disk Varistor, THT, 30VAC, 38VDC, 1600pF; Manufacturer Part Number: 820573001; Manufacturer: Wurth Elektronik; Clamping Voltage: 93V; Energy Absorption: 3J; Operating Voltage (AC): 30V; Operating Voltage (DC): 38V; Pitch: 0.8mm; Power Dissipation: 0.02W; (Reverse) Breakdown Voltage: 47V; (Reverse) Peak Pulse Current: 250A; Category: Surge Protection; Match Code: WE-VD; ComponentLink1Description: Website Link; ComponentLink1URL: https://www.we-online.com/redexpert/article/820573001?ad; ComponentLink2Description: Datasheet Link; ComponentLink2URL: https://www.we-online.com/redexpert/spec/820573001?ad; Mount: Through Hole; Operating Temperature Max: 85°C; Operating Temperature Min: -40°C; Packaging: Tape and Reel; Width: 5mm; Height: 12mm; Diameter: 9mm; Channel Input Capacitance: 1600pF
footprint D9W5H12P0.8
pins: 1, 2

## 820573011
designator RV?, comment 300VAC, 385VDC  (value not drawn)
WE-VD Disk Varistor, THT, 300VAC, 385VDC, 100pF; Manufacturer Part Number: 820573011; Manufacturer: Wurth Elektronik; Clamping Voltage: 775V; Energy Absorption: 35J; Operating Voltage (AC): 300V; Operating Voltage (DC): 385V; Pitch: 1.7mm; Power Dissipation: 0.25W; (Reverse) Breakdown Voltage: 470V; (Reverse) Peak Pulse Current: 1200A; Category: Surge Protection; Match Code: WE-VD; ComponentLink1Description: Website Link; ComponentLink1URL: https://www.we-online.com/redexpert/article/820573011?ad; ComponentLink2Description: Datasheet Link; ComponentLink2URL: https://www.we-online.com/redexpert/spec/820573011?ad; Mount: Through Hole; Operating Temperature Max: 85°C; Operating Temperature Min: -40°C; Packaging: Tape and Reel; Width: 6.4mm; Height: 12.5mm; Diameter: 9mm; Channel Input Capacitance: 100pF
footprint D9W6.4H12.5P1.7
pins: 1, 2

## 820574001
designator RV?, comment 40VAC, 56VDC  (value not drawn)
WE-VD Disk Varistor, THT, 40VAC, 56VDC, 1120pF; Manufacturer Part Number: 820574001; Manufacturer: Wurth Elektronik; Clamping Voltage: 135V; Energy Absorption: 4.3J; Operating Voltage (AC): 40V; Operating Voltage (DC): 56V; Pitch: 1.5mm; Power Dissipation: 0.02W; (Reverse) Breakdown Voltage: 68V; (Reverse) Peak Pulse Current: 250A; Category: Surge Protection; Match Code: WE-VD; ComponentLink1Description: Website Link; ComponentLink1URL: https://www.we-online.com/redexpert/article/820574001?ad; ComponentLink2Description: Datasheet Link; ComponentLink2URL: https://www.we-online.com/redexpert/spec/820574001?ad; Mount: Through Hole; Operating Temperature Max: 85°C; Operating Temperature Min: -40°C; Packaging: Tape and Reel; Width: 5.5mm; Height: 12mm; Diameter: 9mm; Channel Input Capacitance: 1120pF
footprint D9W5.5H12P1.5
pins: 1, 2

## 820574211
designator RV?, comment 420VAC, 560VDC  (value not drawn)
WE-VD Disk Varistor, THT, 420VAC, 560VDC, 78pF; Manufacturer Part Number: 820574211; Manufacturer: Wurth Elektronik; Clamping Voltage: 1120V; Energy Absorption: 43J; Operating Voltage (AC): 420V; Operating Voltage (DC): 560V; Pitch: 2.7mm; Power Dissipation: 0.25W; (Reverse) Breakdown Voltage: 680V; (Reverse) Peak Pulse Current: 1200A; Category: Surge Protection; Match Code: WE-VD; ComponentLink1Description: Website Link; ComponentLink1URL: https://www.we-online.com/redexpert/article/820574211?ad; ComponentLink2Description: Datasheet Link; ComponentLink2URL: https://www.we-online.com/redexpert/spec/820574211?ad; Mount: Through Hole; Operating Temperature Max: 85°C; Operating Temperature Min: -40°C; Packaging: Tape and Reel; Width: 7.5mm; Height: 13mm; Diameter: 9mm; Channel Input Capacitance: 78pF
footprint D9W7.5H13P2.7
pins: 1, 2

## 820574611
designator RV?, comment 460VAC, 615VDC  (value not drawn)
WE-VD Disk Varistor, THT, 460VAC, 615VDC, 75pF; Manufacturer Part Number: 820574611; Manufacturer: Wurth Elektronik; Clamping Voltage: 1240V; Energy Absorption: 45J; Operating Voltage (AC): 460V; Operating Voltage (DC): 615V; Pitch: 3mm; Power Dissipation: 0.25W; (Reverse) Breakdown Voltage: 750V; (Reverse) Peak Pulse Current: 1200A; Category: Surge Protection; Match Code: WE-VD; ComponentLink1Description: Website Link; ComponentLink1URL: https://www.we-online.com/redexpert/article/820574611?ad; ComponentLink2Description: Datasheet Link; ComponentLink2URL: https://www.we-online.com/redexpert/spec/820574611?ad; Mount: Through Hole; Operating Temperature Max: 85°C; Operating Temperature Min: -40°C; Packaging: Tape and Reel; Width: 7.9mm; Height: 13mm; Diameter: 9mm; Channel Input Capacitance: 75pF
footprint D9W7.9H13P3
pins: 1, 2

## 820576001
designator RV?, comment 60VAC, 85VDC  (value not drawn)
WE-VD Disk Varistor, THT, 60VAC, 85VDC, 540pF; Manufacturer Part Number: 820576001; Manufacturer: Wurth Elektronik; Clamping Voltage: 165V; Energy Absorption: 7J; Operating Voltage (AC): 60V; Operating Voltage (DC): 85V; Pitch: 0.8mm; Power Dissipation: 0.25W; (Reverse) Breakdown Voltage: 100V; (Reverse) Peak Pulse Current: 1200A; Category: Surge Protection; Match Code: WE-VD; ComponentLink1Description: Website Link; ComponentLink1URL: https://www.we-online.com/redexpert/article/820576001?ad; ComponentLink2Description: Datasheet Link; ComponentLink2URL: https://www.we-online.com/redexpert/spec/820576001?ad; Mount: Through Hole; Operating Temperature Max: 85°C; Operating Temperature Min: -40°C; Packaging: Tape and Reel; Width: 3.9mm; Height: 12mm; Diameter: 9mm; Channel Input Capacitance: 540pF
footprint D9W3.9H12P0.8
pins: 1, 2